# Altium footprint library WE-RJ45 LAN.PcbLib: 107 footprints (part 3 of 7)
Each footprint in its own frame and in the unit in brackets; x right, y up, seen from the top. Pads: shape width x height; smd on the part's side, far side on the other; paste and mask are expansions set on the pad; w line width, h text height; cw(c..) or ccw(c..) is an arc to the next point about the centre after c.
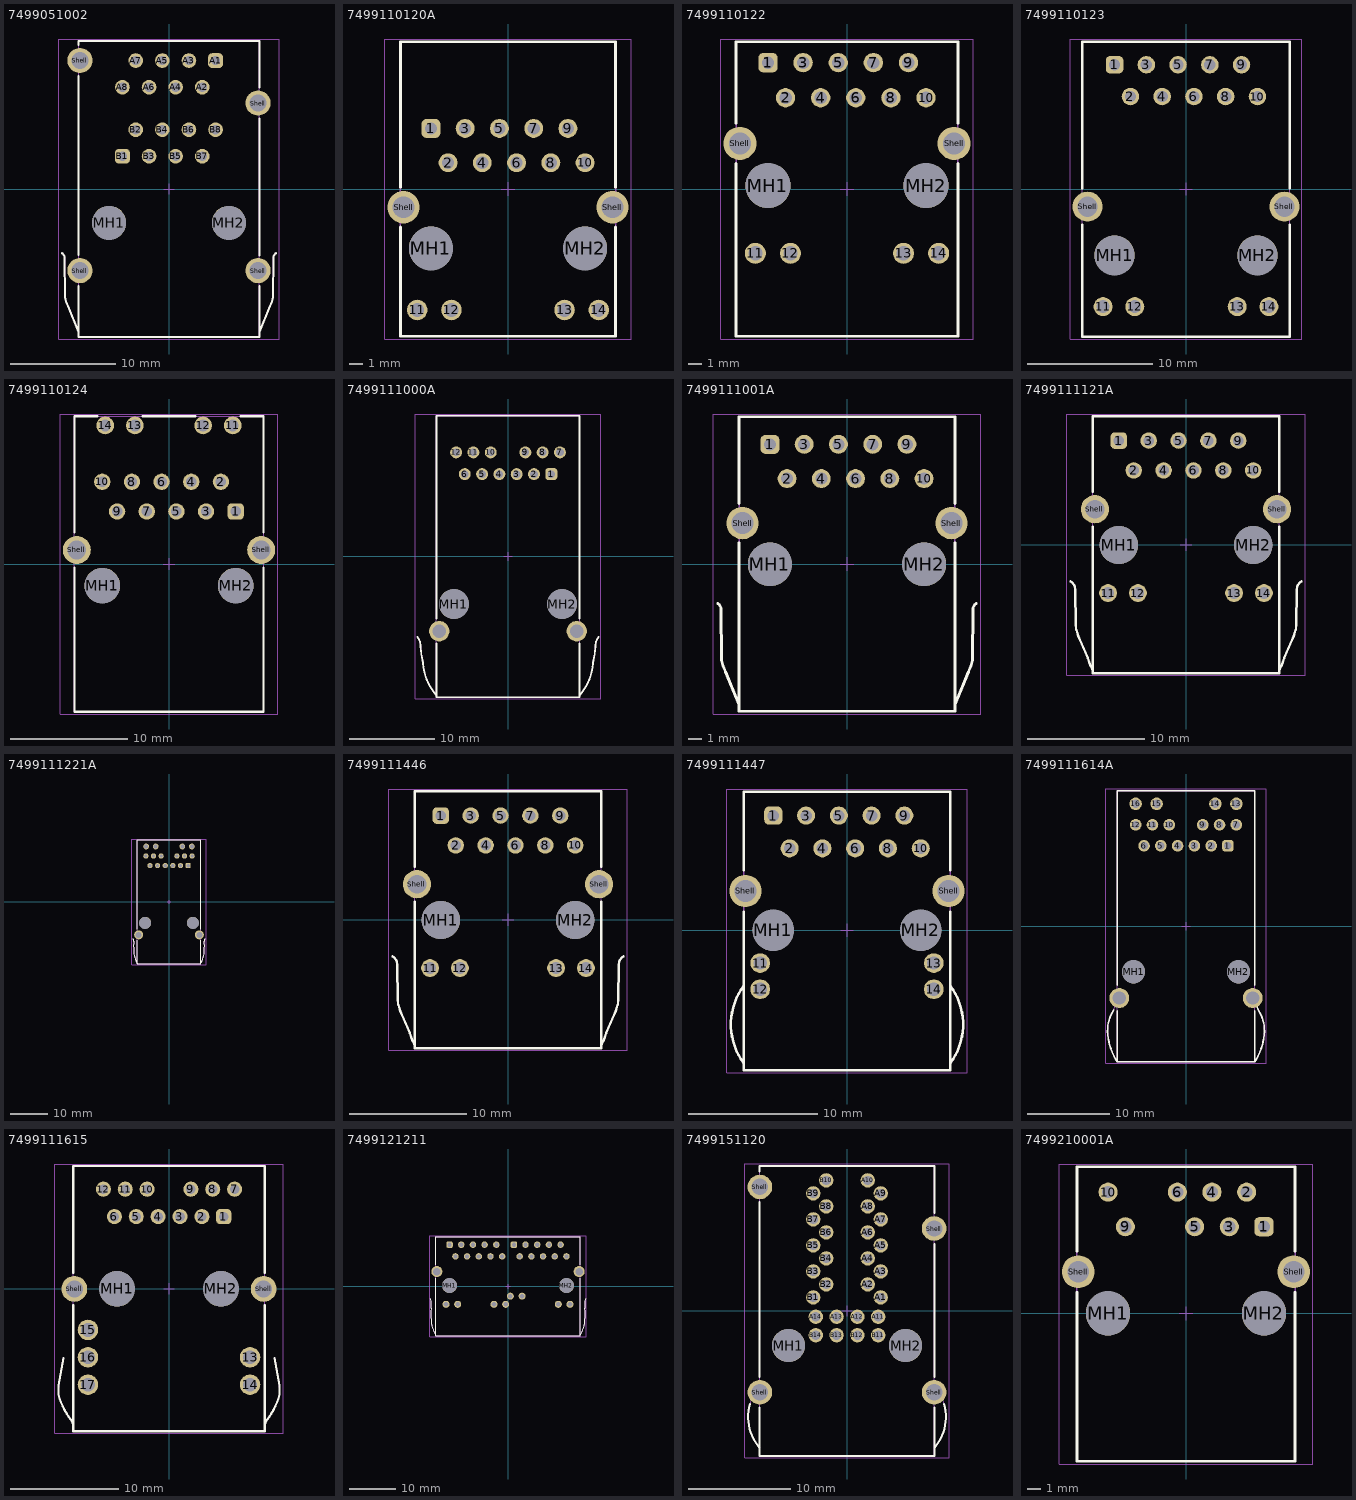
[diagram p2: the footprints below, top view; thin cyan lines are the x and y axes]

## 7499051002 [mm] "LAN Transformer, body 28.25x17.27mm"
height 25.2
pads (22):
  rrect50% 1.4x1.4 hole 0.89: A1(4.445,12.265) B1(-4.445,3.125)
  round 1.4 hole 0.89: A2(3.175,9.725) A3(1.905,12.265) A4(0.635,9.725) A5(-0.635,12.265) A6(-1.905,9.725) A7(-3.175,12.265) A8(-4.445,9.725) B2(-3.175,5.665) B3(-1.905,3.125) B4(-0.635,5.665) B5(0.635,3.125) B6(1.905,5.665) B7(3.175,3.125) B8(4.445,5.665)
  round 3.25 hole 3.25 unplated: MH1(-5.715,-3.225) MH2(5.715,-3.225)
  round 2.4 hole 1.6: Shell(-8.51,-7.795) Shell(-8.51,12.275) Shell(8.51,-7.795) Shell(8.51,8.205)
Top Overlay:
  lines w0.2: -10.218,-6.134 cw(c-10.455,-6.555) -9.972,-6.555 ; -9.975,-6.505 -9.933,-10.32 ; -9.94,-10.321 ccw(c-7.312,-9.899) -9.643,-11.184 -8.639,-13.667 ; -8.635,-9.275 -8.635,-14.125 8.635,-14.125 8.635,-9.275 ; -8.635,-6.315 -8.635,10.775 ; -8.635,13.775 -8.635,14.125 8.635,14.125 8.635,9.675 ; 8.635,-6.325 8.635,6.725 ; 8.639,-13.667 9.643,-11.184 ccw(c7.312,-9.899) 9.94,-10.321 ; 9.933,-10.32 9.975,-6.505 ; 9.972,-6.555 cw(c10.455,-6.555) 10.218,-6.134
Top Designator:
  text ".Designator" at -7.498,-0.5 h1.5
Top Component Outline:
  lines w0.1: -10.218,-6.134 cw(c-10.455,-6.555) -9.972,-6.555 ; -9.975,-6.505 -9.933,-10.32 ; -9.94,-10.321 ccw(c-7.312,-9.899) -9.643,-11.184 -8.639,-13.667 ; 8.639,-13.667 9.643,-11.184 ccw(c7.312,-9.899) 9.94,-10.321 ; 9.933,-10.32 9.975,-6.505 ; 9.972,-6.555 cw(c10.455,-6.555) 10.218,-6.134 ; -8.635,-14.125 -8.635,14.125 8.635,14.125 8.635,-14.125 -8.635,-14.125
Top 3D Body:
  lines w0.1: -10.218,-6.134 cw(c-10.455,-6.555) -9.972,-6.555 ; -9.975,-6.505 -9.933,-10.32 ; -9.94,-10.321 ccw(c-7.312,-9.899) -9.643,-11.184 -8.639,-13.667 ; 8.639,-13.667 9.643,-11.184 ccw(c7.312,-9.899) 9.94,-10.321 ; 9.933,-10.32 9.975,-6.505 ; 9.972,-6.555 cw(c10.455,-6.555) 10.218,-6.134 ; -8.635,-14.125 8.635,-14.125 8.635,14.125 -8.635,14.125 -8.635,-14.125
Top Courtyard:
  lines w0.05: -0.5,0 0.5,0 ; 0,-0.5 0,0.5 ; -10.519,-14.325 10.519,-14.325 10.519,14.325 -10.519,14.325 -10.519,-14.325
3D body "7499051002.stp": height 26.87, standoff -3.75, extent -10.306,-14.125 10.306,14.125

## 7499110120A [mm] "LAN Transformer, body 21.84x15.95mm"
height 16.9
pads (18):
  rrect50% 1.4x1.4 hole 0.9: 1(-5.715,4.49)
  round 1.4 hole 0.9: 2(-4.445,1.95) 3(-3.175,4.49) 4(-1.905,1.95) 5(-0.635,4.49) 6(0.635,1.95) 7(1.905,4.49) 8(3.175,1.95) 9(4.445,4.49) 10(5.715,1.95)
  round 1.52 hole 1.02: 11(-6.73,-8.97) 12(-4.19,-8.97) 13(4.19,-8.97) 14(6.73,-8.97)
  round 3.25 hole 3.25 unplated: MH1(-5.715,-4.4) MH2(5.715,-4.4)
  round 2.4 hole 1.6: Shell(-7.745,-1.35) Shell(7.745,-1.35)
Top Overlay:
  lines w0.2: -7.975,-2.82 -7.975,-10.92 7.975,-10.92 7.975,-2.82 ; -7.975,0.12 -7.975,10.92 7.975,10.92 7.975,0.12
Top Designator:
  text ".Designator" at -7.498,-0.5 h1.5
Top Component Outline:
  lines w0.1: -7.975,-10.92 7.975,-10.92 7.975,10.92 -7.975,10.92 -7.975,-10.92
Top 3D Body:
  lines w0.1: -7.975,-10.92 -7.975,10.92 7.975,10.92 7.975,-10.92 -7.975,-10.92
Top Courtyard:
  lines w0.05: -0.5,0 0.5,0 ; 0,-0.5 0,0.5 ; -9.145,-11.12 9.145,-11.12 9.145,11.12 -9.145,11.12 -9.145,-11.12
3D body "7499110120A.stp": height 16.87, standoff -3.32, extent -8.1,-10.92 8.1,10.92

## 7499110122 [mm] "LAN Transformer, body 21.3x16.04mm"
height 13.5
pads (18):
  rrect50% 1.4x1.4 hole 0.9: 1(-5.715,9.14)
  round 1.4 hole 0.9: 2(-4.445,6.6) 3(-3.175,9.14) 4(-1.905,6.6) 5(-0.635,9.14) 6(0.635,6.6) 7(1.905,9.14) 8(3.175,6.6) 9(4.445,9.14) 10(5.715,6.6)
  round 1.52 hole 1.02: 11(-6.63,-4.65) 12(-4.09,-4.65) 13(4.09,-4.65) 14(6.63,-4.65)
  round 3.25 hole 3.25 unplated: MH1(-5.715,0.25) MH2(5.715,0.25)
  round 2.4 hole 1.6: Shell(-7.745,3.3) Shell(7.745,3.3)
Top Overlay:
  lines w0.2: -8.02,1.85 -8.02,-10.65 8.02,-10.65 8.02,1.85 ; -8.02,4.75 -8.02,10.65 8.02,10.65 8.02,4.75
Top Designator:
  text ".Designator" at -7.498,-0.5 h1.5
Top Component Outline:
  lines w0.1: -8.02,-10.65 -8.02,10.65 8.02,10.65 8.02,-10.65 -8.02,-10.65
Top 3D Body:
  lines w0.1: -8.02,-10.65 8.02,-10.65 8.02,10.65 -8.02,10.65 -8.02,-10.65
Top Courtyard:
  lines w0.05: -0.5,0 0.5,0 ; 0,-0.5 0,0.5 ; -9.145,-10.85 9.145,-10.85 9.145,10.85 -9.145,10.85 -9.145,-10.85
3D body "7499110122.stp": height 13.7, standoff -3.65, extent -8.22,-10.65 8.22,10.65

## 7499110123 [mm] "LAN Transformer, body 23.6x16.6mm"
height 17.1
pads (18):
  rrect50% 1.4x1.4 hole 0.89: 1(-5.715,9.94)
  round 1.4 hole 0.89: 2(-4.445,7.4) 3(-3.175,9.94) 4(-1.905,7.4) 5(-0.635,9.94) 6(0.635,7.4) 7(1.905,9.94) 8(3.175,7.4) 9(4.445,9.94) 10(5.715,7.4)
  round 1.52 hole 1.02: 11(-6.635,-9.41) 12(-4.095,-9.41) 13(4.095,-9.41) 14(6.635,-9.41)
  round 3.2 hole 3.2 unplated: MH1(-5.715,-5.3) MH2(5.715,-5.3)
  round 2.4 hole 1.63: Shell(-7.875,-1.41) Shell(7.875,-1.41)
Top Overlay:
  lines w0.2: -8.3,-2.85 -8.3,-11.8 8.3,-11.8 8.3,-2.85 ; -8.3,0.05 -8.3,11.8 8.3,11.8 8.3,0.05
Top Designator:
  text ".Designator" at -7.498,-0.5 h1.5
Top Component Outline:
  lines w0.1: -8.3,-11.8 8.3,-11.8 8.3,11.8 -8.3,11.8 -8.3,-11.8
Top 3D Body:
  lines w0.1: -8.3,-11.8 -8.3,11.8 8.3,11.8 8.3,-11.8 -8.3,-11.8
Top Courtyard:
  lines w0.05: -0.5,0 0.5,0 ; 0,-0.5 0,0.5 ; -9.275,-12 9.275,-12 9.275,12 -9.275,12 -9.275,-12
3D body "7499110123.stp": height 17.15, standoff -2.75, extent -8.3,-11.8 8.3,11.8

## 7499110124 [mm] "LAN Transformer, body 25.3x16.2mm"
height 13.5
pads (18):
  rrect50% 1.4x1.4 hole 0.9: 1(5.715,4.5)
  round 1.4 hole 0.9: 2(4.445,7.04) 3(3.175,4.5) 4(1.905,7.04) 5(0.635,4.5) 6(-0.635,7.04) 7(-1.905,4.5) 8(-3.175,7.04) 9(-4.445,4.5) 10(-5.715,7.04)
  round 1.52 hole 1.02: 11(5.465,11.87) 12(2.925,11.87) 13(-2.925,11.87) 14(-5.465,11.87)
  round 3.05 hole 3.05 unplated: MH1(-5.715,-1.85) MH2(5.715,-1.85)
  round 2.4 hole 1.6: Shell(-7.9,1.2) Shell(7.9,1.2)
Top Overlay:
  lines w0.2: -8.1,-0.3 -8.1,-12.65 8.1,-12.65 8.1,-0.3 ; -8.1,2.7 -8.1,12.65 -6.15,12.65 ; -2.24,12.65 2.24,12.65 ; 6.15,12.65 8.1,12.65 8.1,2.7
Top Designator:
  text ".Designator" at -7.498,-0.5 h1.5
Top Component Outline:
  lines w0.1: -8.1,-12.65 -8.1,12.65 8.1,12.65 8.1,-12.65 -8.1,-12.65
Top 3D Body:
  lines w0.1: -8.1,-12.65 8.1,-12.65 8.1,12.65 -8.1,12.65 -8.1,-12.65
Top Courtyard:
  lines w0.05: -0.5,0 0.5,0 ; 0,-0.5 0,0.5 ; -9.3,-12.85 -9.3,12.85 9.3,12.85 9.3,-12.85 -9.3,-12.85
3D body "7499110124.stp": height 13.6, standoff -3.45, extent -8.2,-12.65 8.2,12.65

## 7499111000A [mm] "LAN Transformer, body 33.02x16.79mm"
height 15.79
pads (16):
  rrect50% 1.4x1.4 hole 0.89: 1(5.08,9.66)
  round 1.4 hole 0.89: 2(3.05,9.66) 3(1.02,9.66) 4(-1.01,9.66) 5(-3.04,9.66) 6(-5.07,9.66) 7(6.095,12.2) 8(4.065,12.2) 9(2.035,12.2) 10(-2.025,12.2) 11(-4.055,12.2) 12(-6.085,12.2)
  round 3.5 hole 3.5 unplated: MH1(-6.35,-5.58) MH2(6.35,-5.58)
  round 2.4 hole 1.57: Shell(-8.065,-8.76) Shell(8.065,-8.76)
Top Overlay:
  lines w0.2: -10.615,-9.424 cw(c-12,-10.49) -10.255,-10.589 ; -10.252,-10.486 -10.176,-11.433 -9.962,-12.498 ccw(c-3.6,-12.1) -8.395,-16.3 ; -8.395,-10.21 -8.395,-16.51 8.395,-16.51 8.395,-10.21 ; -8.395,-7.31 -8.395,16.51 8.395,16.51 8.395,-7.31 ; 8.395,-16.3 ccw(c3.6,-12.1) 9.962,-12.498 10.176,-11.433 10.252,-10.486 ; 10.255,-10.589 cw(c12,-10.49) 10.615,-9.424
Top Designator:
  text ".Designator" at -7.498,-0.5 h1.5
Top Component Outline:
  lines w0.1: -10.615,-9.424 cw(c-12,-10.49) -10.255,-10.589 ; -10.252,-10.486 -10.176,-11.433 -9.962,-12.498 ccw(c-3.6,-12.1) -8.395,-16.3 ; 8.395,-16.3 ccw(c3.6,-12.1) 9.962,-12.498 10.176,-11.433 10.252,-10.486 ; 10.255,-10.589 cw(c12,-10.49) 10.615,-9.424 ; -8.395,-16.51 8.395,-16.51 8.395,16.51 -8.395,16.51 -8.395,-16.51
Top 3D Body:
  lines w0.1: -10.615,-9.424 cw(c-12,-10.49) -10.255,-10.589 ; -10.252,-10.486 -10.176,-11.433 -9.962,-12.498 ccw(c-3.6,-12.1) -8.395,-16.3 ; 8.395,-16.3 ccw(c3.6,-12.1) 9.962,-12.498 10.176,-11.433 10.252,-10.486 ; 10.255,-10.589 cw(c12,-10.49) 10.615,-9.424 ; -8.395,-16.51 -8.395,16.51 8.395,16.51 8.395,-16.51 -8.395,-16.51
Top Courtyard:
  lines w0.05: -0.5,0 0.5,0 ; 0,-0.5 0,0.5 ; -10.895,-16.71 10.895,-16.71 10.895,16.71 -10.895,16.71 -10.895,-16.71
3D body "7499111000A.stp": height 16.85, standoff -3.45, extent -10.695,-16.51 10.695,16.51

## 7499111001A [mm] "LAN Transformer, body 21.84x16mm"
height 13.95
pads (14):
  rrect50% 1.4x1.4 hole 0.89: 1(-5.715,8.87)
  round 1.4 hole 0.89: 2(-4.445,6.33) 3(-3.175,8.87) 4(-1.905,6.33) 5(-0.635,8.87) 6(0.635,6.33) 7(1.905,8.87) 8(3.175,6.33) 9(4.445,8.87) 10(5.715,6.33)
  round 3.25 hole 3.25 unplated: MH1(-5.715,-0.02) MH2(5.715,-0.02)
  round 2.4 hole 1.63: Shell(-7.745,3.03) Shell(7.745,3.03)
Top Overlay:
  lines w0.2: -9.583,-2.929 cw(c-9.82,-3.35) -9.337,-3.35 ; -9.34,-3.3 -9.298,-7.115 ; -9.305,-7.116 ccw(c-6.677,-6.694) -9.008,-7.979 -8.004,-10.462 ; -8,1.58 -8,-10.92 8,-10.92 8,1.58 ; -8,4.48 -8,10.92 8,10.92 8,4.48 ; 8.004,-10.462 9.008,-7.979 ccw(c6.677,-6.694) 9.305,-7.116 ; 9.298,-7.115 9.34,-3.3 ; 9.337,-3.35 cw(c9.82,-3.35) 9.583,-2.929
Top Designator:
  text ".Designator" at -7.498,-0.5 h1.5
Top Component Outline:
  lines w0.1: -9.583,-2.929 cw(c-9.82,-3.35) -9.337,-3.35 ; -9.34,-3.3 -9.298,-7.115 ; -9.305,-7.116 ccw(c-6.677,-6.694) -9.008,-7.979 -8.004,-10.462 ; 8.004,-10.462 9.008,-7.979 ccw(c6.677,-6.694) 9.305,-7.116 ; 9.298,-7.115 9.34,-3.3 ; 9.337,-3.35 cw(c9.82,-3.35) 9.583,-2.929 ; -8,-10.92 8,-10.92 8,10.92 -8,10.92 -8,-10.92
Top 3D Body:
  lines w0.1: -9.583,-2.929 cw(c-9.82,-3.35) -9.337,-3.35 ; -9.34,-3.3 -9.298,-7.115 ; -9.305,-7.116 ccw(c-6.677,-6.694) -9.008,-7.979 -8.004,-10.462 ; 8.004,-10.462 9.008,-7.979 ccw(c6.677,-6.694) 9.305,-7.116 ; 9.298,-7.115 9.34,-3.3 ; 9.337,-3.35 cw(c9.82,-3.35) 9.583,-2.929 ; -8,-10.92 -8,10.92 8,10.92 8,-10.92 -8,-10.92
Top Courtyard:
  lines w0.05: -0.5,0 0.5,0 ; 0,-0.5 0,0.5 ; -9.9,-11.12 9.9,-11.12 9.9,11.12 -9.9,11.12 -9.9,-11.12
3D body "7499111001A.stp": height 15.8, standoff -3.66, extent -9.671,-10.94 9.671,10.9

## 7499111121A [mm] "LAN Transformer, body 21.84x15.88mm"
height 13.95
pads (18):
  rrect50% 1.4x1.4 hole 0.9: 1(-5.715,8.86)
  round 1.4 hole 0.9: 2(-4.445,6.32) 3(-3.175,8.86) 4(-1.905,6.32) 5(-0.635,8.86) 6(0.635,6.32) 7(1.905,8.86) 8(3.175,6.32) 9(4.445,8.86) 10(5.715,6.32)
  round 1.52 hole 1.02: 11(-6.63,-4.11) 12(-4.09,-4.11) 13(4.09,-4.11) 14(6.63,-4.11)
  round 3.25 hole 3.25 unplated: MH1(-5.715,-0.03) MH2(5.715,-0.03)
  round 2.4 hole 1.6: Shell(-7.745,3.02) Shell(7.745,3.02)
Top Overlay:
  lines w0.2: -9.83,-3.109 cw(c-10.225,-3.801) -9.428,-3.801 -9.37,-6.9 ccw(c-8.1,-6.9) -9.27,-7.394 ccw(c-6.8,-6.9) -9.012,-8.105 -8.345,-9.664 ccw(c-2,-7.78) -7.94,-10.7 ; -7.94,1.53 -7.94,-10.92 7.94,-10.92 7.94,1.53 ; -7.94,4.48 -7.94,10.92 7.94,10.92 7.94,4.48 ; 7.94,-10.7 ccw(c2,-7.78) 8.345,-9.664 9.012,-8.105 ccw(c6.8,-6.9) 9.27,-7.394 ccw(c8.1,-6.9) 9.37,-6.9 9.428,-3.801 cw(c10.225,-3.801) 9.83,-3.109
Top Designator:
  text ".Designator" at -7.498,-0.5 h1.5
Top Component Outline:
  lines w0.1: -9.83,-3.109 cw(c-10.225,-3.801) -9.428,-3.801 -9.37,-6.9 ccw(c-8.1,-6.9) -9.27,-7.394 ccw(c-6.8,-6.9) -9.012,-8.105 -8.345,-9.664 ccw(c-2,-7.78) -7.94,-10.7 ; 7.94,-10.7 ccw(c2,-7.78) 8.345,-9.664 9.012,-8.105 ccw(c6.8,-6.9) 9.27,-7.394 ccw(c8.1,-6.9) 9.37,-6.9 9.428,-3.801 cw(c10.225,-3.801) 9.83,-3.109 ; -7.94,-10.92 -7.94,10.92 7.94,10.92 7.94,-10.92 -7.94,-10.92
Top 3D Body:
  lines w0.1: -9.83,-3.109 cw(c-10.225,-3.801) -9.428,-3.801 -9.37,-6.9 ccw(c-8.1,-6.9) -9.27,-7.394 ccw(c-6.8,-6.9) -9.012,-8.105 -8.345,-9.664 ccw(c-2,-7.78) -7.94,-10.7 ; 7.94,-10.7 ccw(c2,-7.78) 8.345,-9.664 9.012,-8.105 ccw(c6.8,-6.9) 9.27,-7.394 ccw(c8.1,-6.9) 9.37,-6.9 9.428,-3.801 cw(c10.225,-3.801) 9.83,-3.109 ; -7.94,-10.92 7.94,-10.92 7.94,10.92 -7.94,10.92 -7.94,-10.92
Top Courtyard:
  lines w0.05: -0.5,0 0.5,0 ; 0,-0.5 0,0.5 ; -10.13,-11.12 -10.13,11.12 10.13,11.12 10.13,-11.12 -10.13,-11.12
3D body "7499111121A.stp": height 16.01, standoff -3.57, extent -9.923,-10.92 9.923,10.92

## 7499111221A [mm] "LAN Transformer, body 33.02x16.79mm"
height 15.79
pads (20):
  rrect50% 1.4x1.4 hole 0.89: 1(5.08,9.66)
  round 1.4 hole 0.89: 2(3.05,9.66) 3(1.02,9.66) 4(-1.01,9.66) 5(-3.04,9.66) 6(-5.07,9.66) 7(6.155,12.2) 8(4.125,12.2) 9(2.095,12.2) 10(-2.095,12.2) 11(-4.125,12.2) 12(-6.155,12.2)
  round 1.53 hole 1.03: 13(6.09,14.74) 14(3.55,14.74) 15(-3.55,14.74) 16(-6.09,14.74)
  round 3.2 hole 3.2 unplated: MH1(-6.35,-5.58) MH2(6.35,-5.58)
  round 2.4 hole 1.57: Shell(-8.065,-8.76) Shell(8.065,-8.76)
Top Overlay:
  lines w0.2: -9.564,-9.813 cw(c-10.675,-10.425) -9.408,-10.482 ccw(c-5.793,-10.922) -9.435,-10.952 ccw(c15.229,-11.78) -9.364,-13.824 ccw(c-0.945,-12.305) -8.395,-16.51 ; -8.395,-10.26 -8.395,-16.51 ; -8.395,-7.25 -8.395,16.51 8.395,16.51 8.395,-7.25 ; 8.395,-10.26 8.395,-16.51 ; 9.564,-9.813 ccw(c10.675,-10.425) 9.408,-10.482 cw(c5.793,-10.922) 9.435,-10.952 cw(c-15.229,-11.78) 9.364,-13.824 cw(c0.945,-12.305) 8.395,-16.51 ; -8.395,-16.51 8.395,-16.51
Top Designator:
  text ".Designator" at -7.498,-0.5 h1.5
Top Component Outline:
  lines w0.1: -9.564,-9.813 cw(c-10.675,-10.425) -9.408,-10.482 ccw(c-5.793,-10.922) -9.435,-10.952 ccw(c15.229,-11.78) -9.364,-13.824 ccw(c-0.945,-12.305) -8.395,-16.51 ; 9.564,-9.813 ccw(c10.675,-10.425) 9.408,-10.482 cw(c5.793,-10.922) 9.435,-10.952 cw(c-15.229,-11.78) 9.364,-13.824 cw(c0.945,-12.305) 8.395,-16.51 ; -8.395,-16.51 -8.395,16.51 8.395,16.51 8.395,-16.51 ; -8.395,-16.51 8.395,-16.51
Top 3D Body:
  lines w0.1: -9.564,-9.813 cw(c-10.675,-10.425) -9.408,-10.482 ccw(c-5.793,-10.922) -9.435,-10.952 ccw(c15.229,-11.78) -9.364,-13.824 ccw(c-0.945,-12.305) -8.395,-16.51 ; 9.564,-9.813 ccw(c10.675,-10.425) 9.408,-10.482 cw(c5.793,-10.922) 9.435,-10.952 cw(c-15.229,-11.78) 9.364,-13.824 cw(c0.945,-12.305) 8.395,-16.51 ; -8.395,-16.51 8.395,-16.51 ; -8.395,-16.51 -8.395,16.51 8.395,16.51 8.395,-16.51
Top Courtyard:
  lines w0.05: -0.5,0 0.5,0 ; 0,-0.5 0,0.5 ; -9.9,-16.71 9.9,-16.71 9.9,16.71 -9.9,16.71 -9.9,-16.71
3D body "7499111221A.stp": height 15.33, standoff -3.17, extent -9.5,-16.4 9.5,16.4

## 7499111446 [mm] "LAN Transformer, body 21.84x15.88mm"
height 13.95
pads (18):
  rrect50% 1.4x1.4 hole 0.9: 1(-5.715,8.86)
  round 1.4 hole 0.9: 2(-4.445,6.32) 3(-3.175,8.86) 4(-1.905,6.32) 5(-0.635,8.86) 6(0.635,6.32) 7(1.905,8.86) 8(3.175,6.32) 9(4.445,8.86) 10(5.715,6.32)
  round 1.52 hole 1.02: 11(-6.63,-4.11) 12(-4.09,-4.11) 13(4.09,-4.11) 14(6.63,-4.11)
  round 3.25 hole 3.25 unplated: MH1(-5.715,-0.03) MH2(5.715,-0.03)
  round 2.4 hole 1.6: Shell(-7.745,3.02) Shell(7.745,3.02)
Top Overlay:
  lines w0.2: -9.83,-3.109 cw(c-10.225,-3.801) -9.428,-3.801 -9.37,-6.9 ccw(c-8.1,-6.9) -9.27,-7.394 ccw(c-6.8,-6.9) -9.012,-8.105 -8.345,-9.664 ccw(c-2,-7.78) -7.94,-10.7 ; -7.94,1.53 -7.94,-10.92 7.94,-10.92 7.94,1.53 ; -7.94,4.48 -7.94,10.92 7.94,10.92 7.94,4.48 ; 7.94,-10.7 ccw(c2,-7.78) 8.345,-9.664 9.012,-8.105 ccw(c6.8,-6.9) 9.27,-7.394 ccw(c8.1,-6.9) 9.37,-6.9 9.428,-3.801 cw(c10.225,-3.801) 9.83,-3.109
Top Designator:
  text ".Designator" at -7.498,-0.5 h1.5
Top Component Outline:
  lines w0.1: -9.83,-3.109 cw(c-10.225,-3.801) -9.428,-3.801 -9.37,-6.9 ccw(c-8.1,-6.9) -9.27,-7.394 ccw(c-6.8,-6.9) -9.012,-8.105 -8.345,-9.664 ccw(c-2,-7.78) -7.94,-10.7 ; 7.94,-10.7 ccw(c2,-7.78) 8.345,-9.664 9.012,-8.105 ccw(c6.8,-6.9) 9.27,-7.394 ccw(c8.1,-6.9) 9.37,-6.9 9.428,-3.801 cw(c10.225,-3.801) 9.83,-3.109 ; -7.94,-10.92 7.94,-10.92 7.94,10.92 -7.94,10.92 -7.94,-10.92
Top 3D Body:
  lines w0.1: -9.83,-3.109 cw(c-10.225,-3.801) -9.428,-3.801 -9.37,-6.9 ccw(c-8.1,-6.9) -9.27,-7.394 ccw(c-6.8,-6.9) -9.012,-8.105 -8.345,-9.664 ccw(c-2,-7.78) -7.94,-10.7 ; 7.94,-10.7 ccw(c2,-7.78) 8.345,-9.664 9.012,-8.105 ccw(c6.8,-6.9) 9.27,-7.394 ccw(c8.1,-6.9) 9.37,-6.9 9.428,-3.801 cw(c10.225,-3.801) 9.83,-3.109 ; -7.94,-10.92 -7.94,10.92 7.94,10.92 7.94,-10.92 -7.94,-10.92
Top Courtyard:
  lines w0.05: -0.5,0 0.5,0 ; 0,-0.5 0,0.5 ; -10.13,-11.12 -10.13,11.12 10.13,11.12 10.13,-11.12 -10.13,-11.12
3D body "7499111446.stp": height 16.01, standoff -3.52, extent -9.923,-10.92 9.923,10.92

## 7499111447 [mm] "LAN Transformer, body 21.3x16mm"
height 13.55
pads (18):
  rrect50% 1.4x1.4 hole 0.89: 1(-5.715,8.89)
  round 1.4 hole 0.89: 2(-4.445,6.35) 3(-3.175,8.89) 4(-1.905,6.35) 5(-0.635,8.89) 6(0.635,6.35) 7(1.905,8.89) 8(3.175,6.35) 9(4.445,8.89) 10(5.715,6.35)
  round 1.52 hole 1.02: 11(-6.725,-2.54) 12(-6.725,-4.57) 13(6.725,-2.54) 14(6.725,-4.57)
  round 3.2 hole 3.2 unplated: MH1(-5.715,0) MH2(5.715,0)
  round 2.5 hole 1.7: Shell(-7.875,3.05) Shell(7.875,3.05)
Top Overlay:
  lines w0.2: -8,-10.3 cw(c-4,-7.3) -8,-4.3 ; -8,1.45 -8,-10.85 8,-10.85 8,1.45 ; -8,4.65 -8,10.75 8,10.75 8,4.65 ; 8,-10.3 ccw(c4,-7.3) 8,-4.3
Top Designator:
  text ".Designator" at -7.498,-0.5 h1.5
Top Component Outline:
  lines w0.1: -8,-10.3 cw(c-4,-7.3) -8,-4.3 ; 8,-10.3 ccw(c4,-7.3) 8,-4.3 ; -8,-10.85 -8,10.75 8,10.75 8,-10.85 -8,-10.85
Top 3D Body:
  lines w0.1: -8,-10.3 cw(c-4,-7.3) -8,-4.3 ; 8,-10.3 ccw(c4,-7.3) 8,-4.3 ; -8,-10.85 8,-10.85 8,10.75 -8,10.75 -8,-10.85
Top Courtyard:
  lines w0.05: -0.5,0 0.5,0 ; 0,-0.5 0,0.5 ; -9.325,-11.05 9.325,-11.05 9.325,10.95 -9.325,10.95 -9.325,-11.05
3D body "7499111447.stp": height 14.65, standoff -2.98, extent -8.956,-10.85 8.956,10.75

## 7499111614A [mm] "LAN Transformer, body 33.02x16.87mm"
height 13.87
pads (20):
  rrect50% 1.4x1.4 hole 0.9: 1(5.075,9.73)
  round 1.4 hole 0.9: 2(3.045,9.73) 3(1.015,9.73) 4(-1.015,9.73) 5(-3.045,9.73) 6(-5.075,9.73) 7(6.085,12.27) 8(4.055,12.27) 9(2.025,12.27) 10(-2.025,12.27) 11(-4.055,12.27) 12(-6.085,12.27)
  round 1.52 hole 1.02: 13(6.09,14.81) 14(3.55,14.81) 15(-3.55,14.81) 16(-6.09,14.81)
  round 2.8 hole 2.8 unplated: MH1(-6.35,-5.51) MH2(6.35,-5.51)
  round 2.4 hole 1.6: Shell(-8.065,-8.69) Shell(8.065,-8.69)
Top Overlay:
  lines w0.2: -8.751,-10.131 ccw(c-4.7,-12.7) -9.497,-12.702 ccw(c-2.196,-12.382) -8.3,-16.4 ; -8.3,-10.25 -8.3,-16.4 ; -8.3,-7.13 -8.3,16.4 8.3,16.4 8.3,-7.13 ; 8.3,-10.25 8.3,-16.4 ; 8.664,-9.071 ccw(c9.95,-9.5) 8.751,-10.131 cw(c4.7,-12.7) 9.497,-12.702 cw(c2.196,-12.382) 8.3,-16.4 ; -8.3,-16.4 8.3,-16.4
Top Designator:
  text ".Designator" at -7.498,-0.5 h1.5
Top Component Outline:
  lines w0.1: -8.664,-9.071 cw(c-9.95,-9.5) -8.751,-10.131 ccw(c-4.7,-12.7) -9.497,-12.702 ccw(c-2.196,-12.382) -8.3,-16.4 ; 8.664,-9.071 ccw(c9.95,-9.5) 8.751,-10.131 cw(c4.7,-12.7) 9.497,-12.702 cw(c2.196,-12.382) 8.3,-16.4 ; -8.3,-16.4 8.3,-16.4 ; -8.3,-16.4 -8.3,16.4 8.3,16.4 8.3,-16.4
Top 3D Body:
  lines w0.1: -8.664,-9.071 cw(c-9.95,-9.5) -8.751,-10.131 ccw(c-4.7,-12.7) -9.497,-12.702 ccw(c-2.196,-12.382) -8.3,-16.4 ; 8.664,-9.071 ccw(c9.95,-9.5) 8.751,-10.131 cw(c4.7,-12.7) 9.497,-12.702 cw(c2.196,-12.382) 8.3,-16.4 ; -8.3,-16.4 8.3,-16.4 ; -8.3,-16.4 -8.3,16.4 8.3,16.4 8.3,-16.4
Top Courtyard:
  lines w0.05: -0.5,0 0.5,0 ; 0,-0.5 0,0.5 ; -9.7,-16.6 -9.7,16.6 9.7,16.6 9.7,-16.6 -9.7,-16.6
3D body "7499111614A.stp": height 15.1, standoff -3.4, extent -9.5,-16.4 9.5,16.4

## 7499111615 [mm] "10/100/1000Base-T, THT, 1x1, Tab up, with shield tabs, with LED L-R green/orange-yellow, ETR, low profile"
height 11.3
pads (21):
  rrect50% 1.4x1.4 hole 0.89: 1(5.08,6.71)
  round 1.4 hole 0.89: 2(3.05,6.71) 3(1.02,6.71) 4(-1.01,6.71) 5(-3.04,6.71) 6(-5.07,6.71) 7(6.09,9.25) 8(4.06,9.25) 9(2.03,9.25) 10(-2.03,9.25) 11(-4.06,9.25) 12(-6.09,9.25)
  round 1.9 hole 1.27: 13(7.52,-6.35) 14(7.52,-8.89) 15(-7.52,-3.81) 16(-7.52,-6.35) 17(-7.52,-8.89)
  round 3.3 hole 3.3 unplated: MH1(-4.825,0) MH2(4.825,0)
  round 2.4 hole 1.57: Shell(-8.79,0) Shell(8.79,0)
Top Overlay:
  lines w0.2: -9.803,-6.408 -10.253,-8.957 ccw(c-3.459,-9.443) -10.261,-9.802 ccw(c-3.781,-8.079) -9.271,-11.929 cw(c-10.549,-13.09) -8.89,-12.61 ; -8.89,-1.5 -8.89,-13.21 8.89,-13.21 8.89,-1.5 ; -8.89,1.5 -8.89,11.39 8.89,11.39 8.89,1.5 ; 8.89,-12.61 cw(c10.549,-13.09) 9.271,-11.929 ccw(c3.781,-8.079) 10.261,-9.802 ccw(c3.459,-9.443) 10.253,-8.957 9.803,-6.408
Top Designator:
  text ".Designator" at -7.498,-0.5 h1.5
Top Component Outline:
  lines w0.1: -9.803,-6.408 -10.253,-8.957 ccw(c-3.459,-9.443) -10.261,-9.802 ccw(c-3.781,-8.079) -9.271,-11.929 cw(c-10.549,-13.09) -8.89,-12.61 ; 8.89,-12.61 cw(c10.549,-13.09) 9.271,-11.929 ccw(c3.781,-8.079) 10.261,-9.802 ccw(c3.459,-9.443) 10.253,-8.957 9.803,-6.408 ; -8.89,-13.21 -8.89,11.39 8.89,11.39 8.89,-13.21 -8.89,-13.21
Top 3D Body:
  lines w0.1: -9.803,-6.408 -10.253,-8.957 ccw(c-3.459,-9.443) -10.261,-9.802 ccw(c-3.781,-8.079) -9.271,-11.929 cw(c-10.549,-13.09) -8.89,-12.61 ; 8.89,-12.61 cw(c10.549,-13.09) 9.271,-11.929 ccw(c3.781,-8.079) 10.261,-9.802 ccw(c3.459,-9.443) 10.253,-8.957 9.803,-6.408 ; -8.89,-13.21 8.89,-13.21 8.89,11.39 -8.89,11.39 -8.89,-13.21
Top Courtyard:
  lines w0.05: -0.5,0 0.5,0 ; 0,-0.5 0,0.5 ; -10.587,-13.41 10.587,-13.41 10.587,11.59 -10.587,11.59 -10.587,-13.41
3D body "7499111615.stp": height 12.85, standoff -3.25, extent -10.387,-13.21 10.387,11.39

## 7499121211 [mm] "10/100/1000Base-T, THT, 1x2, Tab down, with shield tabs, with LED L-R green-yellow, ETR"
height 15.71
pads (32):
  rrect50% 1.4x1.4 hole 0.89: A1(-12.7,9.04) B1(1.27,9.04)
  round 1.4 hole 0.89: A2(-11.43,6.5) A3(-10.16,9.04) A4(-8.89,6.5) A5(-7.62,9.04) A6(-6.35,6.5) A7(-5.08,9.04) A8(-3.81,6.5) A9(-2.54,9.04) A10(-1.27,6.5) B2(2.54,6.5) B3(3.81,9.04) B4(5.08,6.5) B5(6.35,9.04) B6(7.62,6.5) B7(8.89,9.04) B8(10.16,6.5) B9(11.43,9.04) B10(12.7,6.5)
  round 1.52 hole 1.02: A11(-13.47,-3.91) A12(-10.93,-3.91) A13(-3.05,-3.91) A14(-0.51,-3.91) B11(0.51,-2.14) B12(3.05,-2.14) B13(10.93,-3.91) B14(13.47,-3.91)
  round 3.25 hole 3.25 unplated: MH1(-12.7,0.15) MH2(12.7,0.15)
  round 2.4 hole 1.63: Shell(-15.465,3.2) Shell(15.465,3.2)
Top Overlay:
  lines w0.2: -16.862,-2.641 cw(c-17.973,-3.253) -16.706,-3.31 -16.713,-4.722 ccw(c-13.098,-5.162) -16.74,-5.192 ccw(c7.924,-6.02) -16.669,-8.064 ccw(c-8.25,-6.545) -15.7,-10.75 ; -15.7,1.75 -15.7,-10.75 ; -15.7,4.65 -15.7,10.75 15.7,10.75 15.7,4.65 ; 15.7,1.75 15.7,-10.75 ; 16.862,-2.641 ccw(c17.973,-3.253) 16.706,-3.31 16.713,-4.722 cw(c13.098,-5.162) 16.74,-5.192 cw(c-7.924,-6.02) 16.669,-8.064 cw(c8.25,-6.545) 15.7,-10.75 ; -15.7,-10.75 15.7,-10.75
Top Designator:
  text ".Designator" at -7.498,-0.5 h1.5
Top Component Outline:
  lines w0.1: -16.862,-2.641 cw(c-17.973,-3.253) -16.706,-3.31 -16.713,-4.722 ccw(c-13.098,-5.162) -16.74,-5.192 ccw(c7.924,-6.02) -16.669,-8.064 ccw(c-8.25,-6.545) -15.7,-10.75 ; 16.862,-2.641 ccw(c17.973,-3.253) 16.706,-3.31 16.713,-4.722 cw(c13.098,-5.162) 16.74,-5.192 cw(c-7.924,-6.02) 16.669,-8.064 cw(c8.25,-6.545) 15.7,-10.75 ; -15.7,-10.75 15.7,-10.75 ; -15.7,-10.75 -15.7,10.75 15.7,10.75 15.7,-10.75
Top 3D Body:
  lines w0.1: -16.862,-2.641 cw(c-17.973,-3.253) -16.706,-3.31 -16.713,-4.722 ccw(c-13.098,-5.162) -16.74,-5.192 ccw(c7.924,-6.02) -16.669,-8.064 ccw(c-8.25,-6.545) -15.7,-10.75 ; 16.862,-2.641 ccw(c17.973,-3.253) 16.706,-3.31 16.713,-4.722 cw(c13.098,-5.162) 16.74,-5.192 cw(c-7.924,-6.02) 16.669,-8.064 cw(c8.25,-6.545) 15.7,-10.75 ; -15.7,-10.75 -15.7,10.75 15.7,10.75 15.7,-10.75 ; -15.7,-10.75 15.7,-10.75
Top Courtyard:
  lines w0.05: -0.5,0 0.5,0 ; 0,-0.5 0,0.5 ; -17.062,-10.95 -17.062,10.95 17.062,10.95 17.062,-10.95 -17.062,-10.95
3D body "7499121211.stp": height 14.77, standoff -3.7, extent -16.923,-10.75 16.923,10.75

## 7499151120 [mm] "LAN Transformer, body 28.3x17.09mm"
height 25.25
pads (34):
  round 1.4 hole 0.9: A1(3.3,1.32) A2(2.03,2.59) A3(3.3,3.86) A4(2.03,5.13) A5(3.3,6.4) A6(2.03,7.67) A7(3.3,8.94) A8(2.03,10.21) A9(3.3,11.48) A10(2.03,12.75) A11(3.045,-0.57) A12(1.015,-0.57) A13(-1.015,-0.57) A14(-3.045,-0.57) B1(-3.3,1.32) B2(-2.03,2.59) B3(-3.3,3.86) B4(-2.03,5.13) B5(-3.3,6.4) B6(-2.03,7.67) B7(-3.3,8.94) B8(-2.03,10.21) B9(-3.3,11.48) B10(-2.03,12.75) B11(3.045,-2.37) B12(1.015,-2.37) B13(-1.015,-2.37) B14(-3.045,-2.37)
  round 3.25 hole 3.25 unplated: MH1(-5.715,-3.38) MH2(5.715,-3.38)
  round 2.4 hole 1.6: Shell(-8.505,-7.95) Shell(-8.505,12.11) Shell(8.505,-7.95) Shell(8.505,8.05)
Top Overlay:
  lines w0.2: -9.485,-9.104 ccw(c-5.055,-10.35) -8.545,-13.35 ; -8.545,-9.45 -8.545,-14.15 8.545,-14.15 8.545,-9.45 ; -8.545,-6.45 -8.545,10.62 ; -8.545,13.6 -8.545,14.15 8.545,14.15 8.545,9.55 ; 8.545,-13.35 ccw(c5.055,-10.35) 9.485,-9.104 ; 8.545,-6.45 8.545,6.55
Top Designator:
  text ".Designator" at -7.498,-0.5 h1.5
Top Component Outline:
  lines w0.1: -8.563,-7.371 ccw(c-5.055,-10.35) -8.545,-13.35 ; 8.545,-13.35 ccw(c5.055,-10.35) 8.563,-7.371 ; -8.545,-14.15 -8.545,14.15 8.545,14.15 8.545,-14.15 -8.545,-14.15
Top 3D Body:
  lines w0.1: -8.563,-7.371 ccw(c-5.055,-10.35) -8.545,-13.35 ; 8.545,-13.35 ccw(c5.055,-10.35) 8.563,-7.371 ; -8.545,-14.15 8.545,-14.15 8.545,14.15 -8.545,14.15 -8.545,-14.15
Top Courtyard:
  lines w0.05: -0.5,0 0.5,0 ; 0,-0.5 0,0.5 ; -10,-14.35 10,-14.35 10,14.35 -10,14.35 -10,-14.35
3D body "7499151120.stp": height 26.5, standoff -3.8, extent -9.744,-14.27 9.744,14.231

## 7499210001A [mm] "LAN Transformer, body 21.84x16mm"
height 13.74
pads (12):
  rrect50% 1.4x1.4 hole 0.89: 1(5.715,6.35)
  round 1.4 hole 0.89: 2(4.445,8.89) 3(3.175,6.35) 4(1.905,8.89) 5(0.635,6.35) 6(-0.635,8.89) 9(-4.445,6.35) 10(-5.715,8.89)
  round 3.25 hole 3.25 unplated: MH1(-5.715,0) MH2(5.715,0)
  round 2.4 hole 1.6: Shell(-7.9,3.05) Shell(7.9,3.05)
Top Overlay:
  lines w0.2: -8,1.55 -8,-10.85 8,-10.85 8,1.55 ; -8,4.55 -8,10.75 8,10.75 8,4.55
Top Designator:
  text ".Designator" at -7.498,-0.5 h1.5
Top Component Outline:
  lines w0.1: -8,-10.85 -8,10.75 8,10.75 8,-10.85 -8,-10.85
Top 3D Body:
  lines w0.1: -8,-10.85 8,-10.85 8,10.75 -8,10.75 -8,-10.85
Top Courtyard:
  lines w0.05: -0.5,0 0.5,0 ; 0,-0.5 0,0.5 ; -9.3,-11.05 9.3,-11.05 9.3,10.95 -9.3,10.95 -9.3,-11.05
3D body "7499210001A.stp": height 13.78, standoff -2.62, extent -8.1,-10.85 8.1,10.75